# Altium integrated library Capacitor.IntLib: 74 symbols
Pins are listed as number, name and electrical type; pins without a type are passive.

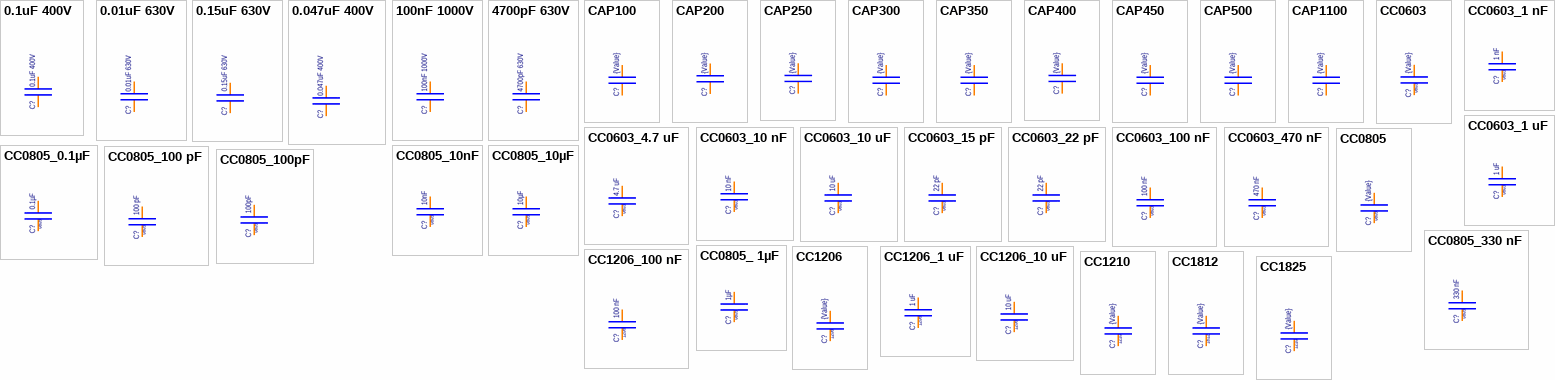
[diagram p0: symbols 0.1uF 400V to CC1825]

## 0.1uF 400V
designator C?  value 0.1uF 400V  (hidden comment: *)
Tolerance: 10%; Publisher: Catcatcat Electronics; website developer: http://catcatcat.d-lan.dp.ua/; ComponentLink1Description: Manufacturer URL; ComponentLink2Description: Datasheet; ComponentLink3Description: Dealer; ComponentLink4Description: DealerАlternative; Assembly type: Manual Part
footprint 0.1X400V
pins: 1, 2

## 0.01uF 630V
designator C?  value 0.01uF 630V  (hidden comment: *)
Tolerance: 10%; Publisher: Catcatcat Electronics; website developer: http://catcatcat.d-lan.dp.ua/; ComponentLink1Description: Manufacturer URL; ComponentLink2Description: Datasheet; ComponentLink3Description: Dealer; ComponentLink4Description: DealerАlternative; Assembly type: Manual Part
footprint CAP250
pins: 1, 2

## 0.15uF 630V
designator C?  value 0.15uF 630V  (hidden comment: *)
Tolerance: 10%; Publisher: Catcatcat Electronics; website developer: http://catcatcat.d-lan.dp.ua/; ComponentLink1Description: Manufacturer URL; ComponentLink2Description: Datasheet; ComponentLink3Description: Dealer; ComponentLink4Description: DealerАlternative; Assembly type: Manual Part
footprint 0.15X630V
pins: 1, 2

## 0.047uF 400V
designator C?  value 0.047uF 400V  (hidden comment: *)
Tolerance: 10%; Publisher: Catcatcat Electronics; website developer: http://catcatcat.d-lan.dp.ua/; ComponentLink1Description: Manufacturer URL; ComponentLink2Description: Datasheet; ComponentLink3Description: Dealer; ComponentLink4Description: DealerАlternative; Assembly type: Manual Part
footprint 0.047X400V
pins: 1, 2

## 100nF 1000V
designator C?  value 100nF 1000V  (hidden comment: *)
Tolerance: 10%; Publisher: Catcatcat Electronics; website developer: http://catcatcat.d-lan.dp.ua/; ComponentLink1Description: Manufacturer URL; ComponentLink2Description: Datasheet; ComponentLink3Description: Dealer; ComponentLink4Description: DealerАlternative; Assembly type: Manual Part
footprint Z5U
pins: 1, 2

## 4700pF 630V
designator C?  value 4700pF 630V  (hidden comment: *)
Tolerance: 10%; Publisher: Catcatcat Electronics; website developer: http://catcatcat.d-lan.dp.ua/; ComponentLink1Description: Manufacturer URL; ComponentLink2Description: Datasheet; ComponentLink3Description: Dealer; ComponentLink4Description: DealerАlternative; Assembly type: Manual Part
footprint CAP200
pins: 1, 2

## CAP100
designator C?  value {Value}  (hidden comment: *)
Tolerance: 10%; Publisher: Catcatcat Electronics; website developer: http://catcatcat.d-lan.dp.ua/; ComponentLink1Description: Manufacturer URL; ComponentLink2Description: Datasheet; ComponentLink3Description: Dealer; ComponentLink4Description: DealerАlternative; Assembly type: Manual Part
footprint CAP100
pins: A, B

## CAP200
designator C?  value {Value}  (hidden comment: *)
Tolerance: 10%; Publisher: Catcatcat Electronics; website developer: http://catcatcat.d-lan.dp.ua/; ComponentLink1Description: Manufacturer URL; ComponentLink2Description: Datasheet; ComponentLink3Description: Dealer; ComponentLink4Description: DealerАlternative; Assembly type: Manual Part
footprint CAP200
pins: 1, 2

## CAP250
designator C?  value {Value}  (hidden comment: *)
Tolerance: 10%; Publisher: Catcatcat Electronics; website developer: http://catcatcat.d-lan.dp.ua/; ComponentLink1Description: Manufacturer URL; ComponentLink2Description: Datasheet; ComponentLink3Description: Dealer; ComponentLink4Description: DealerАlternative; Assembly type: Manual Part
footprint CAP250
pins: 1, 2

## CAP300
designator C?  value {Value}  (hidden comment: *)
Tolerance: 10%; Publisher: Catcatcat Electronics; website developer: http://catcatcat.d-lan.dp.ua/; ComponentLink1Description: Manufacturer URL; ComponentLink2Description: Datasheet; ComponentLink3Description: Dealer; ComponentLink4Description: DealerАlternative; Assembly type: Manual Part
footprint CAP300
pins: A, B

## CAP350
designator C?  value {Value}  (hidden comment: *)
Tolerance: 10%; Publisher: Catcatcat Electronics; website developer: http://catcatcat.d-lan.dp.ua/; ComponentLink1Description: Manufacturer URL; ComponentLink2Description: Datasheet; ComponentLink3Description: Dealer; ComponentLink4Description: DealerАlternative; Assembly type: Manual Part
footprint CAP350
pins: A, B

## CAP400
designator C?  value {Value}  (hidden comment: *)
Tolerance: 10%; Publisher: Catcatcat Electronics; website developer: http://catcatcat.d-lan.dp.ua/; ComponentLink1Description: Manufacturer URL; ComponentLink2Description: Datasheet; ComponentLink3Description: Dealer; ComponentLink4Description: DealerАlternative; Assembly type: Manual Part
footprint CAP400
pins: A, B

## CAP450
designator C?  value {Value}  (hidden comment: *)
Tolerance: 10%; Publisher: Catcatcat Electronics; website developer: http://catcatcat.d-lan.dp.ua/; ComponentLink1Description: Manufacturer URL; ComponentLink2Description: Datasheet; ComponentLink3Description: Dealer; ComponentLink4Description: DealerАlternative; Assembly type: Manual Part
footprint CAP450
pins: A, B

## CAP500
designator C?  value {Value}  (hidden comment: *)
Tolerance: 10%; Publisher: Catcatcat Electronics; website developer: http://catcatcat.d-lan.dp.ua/; ComponentLink1Description: Manufacturer URL; ComponentLink2Description: Datasheet; ComponentLink3Description: Dealer; ComponentLink4Description: DealerАlternative; Assembly type: Manual Part
footprint CAP500
pins: A, B

## CAP1100
designator C?  value {Value}  (hidden comment: *)
Tolerance: 10%; Publisher: Catcatcat Electronics; website developer: http://catcatcat.d-lan.dp.ua/; ComponentLink1Description: Manufacturer URL; ComponentLink2Description: Datasheet; ComponentLink3Description: Dealer; ComponentLink4Description: DealerАlternative; Assembly type: Manual Part
footprint CAP1100
pins: 1, 2

## CC0603
designator C?  value {Value}  (hidden comment: *)
Tolerance: 10%; Voltage: 50 Vdc; Temp.Characteristic: X7R; ComponentLink1URL: http://www.samsungsem.com/global/support/product-search/index.jsp#; Package / Case: 0603(1608) 0.8 mm; Pricing: 0.0018$; Publisher: Catcatcat Electronics; website developer: http://catcatcat.d-lan.dp.ua/; ComponentLink1Description: Manufacturer URL; ComponentLink2Description: Datasheet; ComponentLink3Description: Dealer; ComponentLink4Description: DealerАlternative; ComponentLink4URL: https://voron.ua; Assembly type: Manual Part
footprint CC0603
footprint CD0603
pins: 1, 2 1
text: 0603

## CC0603_1 nF
designator C?  value 1 nF  (hidden comment: *)
Chip Capacitor, 1 nF, +/- 10%, 50 V, -55 to 125 degC, 0603 (1608 Metric); Part Number: CL10B103KB8NNNC; PricingDealer: 0.0000019; Voltage: 50 Vdc; Temp.Characteristic: X7R; ComponentLink1URL: http://www.samsungsem.com/global/support/product-search/index.jsp#; ComponentLink2URL: http://www.samsungsem.com/kr/front/downloadcms.do?path=/kr/support/product-search/mlcc/__icsFiles/afieldfile/2016/08/18&fileName=S_CL10B103KC8NNNC.pdf; Package / Case: 0603(1608) 0.8 mm; Pricing: 0.0018; Publisher: Catcatcat Electronics; Tolerance: 10%; website developer: http://catcatcat.d-lan.dp.ua/; ComponentLink1Description: Manufacturer URL; ComponentLink2Description: Datasheet; ComponentLink3Description: Dealer; ComponentLink3URL: https://detail.1688.com/offer/521370614975.html; ComponentLink4Description: DealerАlternative; Assembly type: Manual Part
footprint CC0603
footprint CD0603
pins: 1, 2 1
text: 0603

## CC0603_1 uF
designator C?  value 1 uF  (hidden comment: *)
Chip Capacitor, 1 uF, +/- 10%, 50 V, -55 to 125 degC, 0603 (1608 Metric); Part Number: CL10B105KA8NNNC; PricingDealer: 0.00066; Voltage: 25 Vdc; Temp.Characteristic: X7R; ComponentLink1URL: http://www.samsungsem.com/global/support/product-search/index.jsp#; ComponentLink2URL: http://www.samsungsem.com/kr/front/downloadcms.do?path=/kr/support/product-search/mlcc/__icsFiles/afieldfile/2016/08/18&fileName=S_CL10B105KA8NNNC.pdf; Package / Case: 0603(1608) 0.8 mm; Pricing: 0.0018; Publisher: Catcatcat Electronics; Tolerance: ±10 %; website developer: http://catcatcat.d-lan.dp.ua/; ComponentLink1Description: Manufacturer URL; ComponentLink2Description: Datasheet; ComponentLink3Description: Dealer; ComponentLink3URL: https://detail.1688.com/offer/520472547450.html; ComponentLink4Description: DealerАlternative; Assembly type: Manual Part
footprint CC0603
footprint CD0603
pins: 1, 2 1
text: 0603

## CC0603_4.7 uF
designator C?  value 4.7 uF  (hidden comment: *)
Chip Capacitor, 4.7 uF, +/- 10%, 50 V, -55 to 125 degC, 0603 (1608 Metric); Part Number: CL10B475KQ8NQND; PricingDealer: 0.000368; Voltage: 6.3 Vdc; Temp.Characteristic: X7R; ComponentLink1URL: http://www.samsungsem.com/global/index.jsp; ComponentLink2URL: http://www.samsungsem.com/kr/support/product-search/mlcc/__icsFiles/afieldfile/2017/10/14/Spec%20sheet_CL10B475KQ8NQND.pdf; Package / Case: 0603(1608) 0.8 mm; Publisher: Catcatcat Electronics; Tolerance: ±10 %; website developer: http://catcatcat.d-lan.dp.ua/; ComponentLink1Description: Manufacturer URL; ComponentLink2Description: Datasheet; ComponentLink3Description: Dealer; ComponentLink3URL: https://detail.1688.com/offer/525123532117.html; ComponentLink4Description: DealerАlternative; ComponentLink4URL: https://voron.ua/; Assembly type: Manual Part
footprint CC0603
footprint CD0603
pins: 1, 2 1
text: 0603

## CC0603_10 nF
designator C?  value 10 nF  (hidden comment: *)
Chip Capacitor, 10 nF, +/- 10%, 50 V, -55 to 125 degC, 0603 (1608 Metric); Part Number: CL10B103KB8NNNC; PricingDealer: 0.0000019; Voltage: 50 Vdc; Temp.Characteristic: X7R; ComponentLink1URL: http://www.samsungsem.com/global/support/product-search/index.jsp#; ComponentLink2URL: http://www.samsungsem.com/kr/front/downloadcms.do?path=/kr/support/product-search/mlcc/__icsFiles/afieldfile/2016/08/18&fileName=S_CL10B103KC8NNNC.pdf; Package / Case: 0603(1608) 0.8 mm; Pricing: 0.0018; Publisher: Catcatcat Electronics; Tolerance: 10%; website developer: http://catcatcat.d-lan.dp.ua/; ComponentLink1Description: Manufacturer URL; ComponentLink2Description: Datasheet; ComponentLink3Description: Dealer; ComponentLink3URL: https://detail.1688.com/offer/521370614975.html; ComponentLink4Description: DealerАlternative; Assembly type: Manual Part
footprint CC0603
footprint CD0603
pins: 1, 2 1
text: 0603

## CC0603_10 uF
designator C?  value 10 uF  (hidden comment: *)
Chip Capacitor, 10 uF, +/- 10%, 50 V, -55 to 125 degC, 0603 (1608 Metric); Part Number: CL10B106MQ8NRNC; PricingDealer: 0.00073; Tolerance: ±20 %; Voltage: 6.3 Vdc; Temp.Characteristic: X7R; ComponentLink1URL: http://www.samsungsem.com/global/support/product-search/index.jsp#; ComponentLink2URL: http://www.samsungsem.com/kr/front/downloadcms.do?path=/kr/support/product-search/mlcc/__icsFiles/afieldfile/2016/08/18&fileName=S_CL10B106MQ8NRNC.pdf; Package / Case: 0603(1608) 0.8 mm; Publisher: Catcatcat Electronics; website developer: http://catcatcat.d-lan.dp.ua/; ComponentLink1Description: Manufacturer URL; ComponentLink2Description: Datasheet; ComponentLink3Description: Dealer; ComponentLink3URL: https://detail.1688.com/offer/520907160439.html; ComponentLink4Description: DealerАlternative; Assembly type: Manual Part
footprint CC0603
footprint CD0603
pins: 1, 2 1
text: 0603

## CC0603_15 pF
designator C?  value 22 pF  (hidden comment: *)
Chip Capacitor, 15 pF, +/- 10%, 50 V, -55 to 125 degC, 0603 (1608 Metric); Part Number: CL10C150JB8NNND; PricingDealer: 0.0000014; Tolerance: ±5 %; Voltage: 50 Vdc; Temp.Characteristic: C0G; ComponentLink1URL: http://www.samsungsem.com/global/support/product-search/index.jsp#; ComponentLink2URL: http://www.samsungsem.com/kr/front/downloadcms.do?path=/kr/support/product-search/mlcc/__icsFiles/afieldfile/2016/08/18&fileName=S_CL10C150JB8NNND.pdf; Package / Case: 0603(1608) 0.8 mm; Pricing: 0.0018; Publisher: Catcatcat Electronics; website developer: http://catcatcat.d-lan.dp.ua/; ComponentLink1Description: Manufacturer URL; ComponentLink2Description: Datasheet; ComponentLink3Description: Dealer; ComponentLink3URL: https://detail.1688.com/offer/536480410744.html; ComponentLink4Description: DealerАlternative; Assembly type: Manual Part
footprint CC0603
footprint CD0603
pins: 1, 2 1
text: 0603

## CC0603_22 pF
designator C?  value 22 pF  (hidden comment: *)
Chip Capacitor, 22 pF, +/- 10%, 50 V, -55 to 125 degC, 0603 (1608 Metric); Part Number: CL10C220JB8NNNL; PricingDealer: 0.0012; Tolerance: ±5 %; Voltage: 50 Vdc; Temp.Characteristic: C0G; ComponentLink1URL: http://www.samsungsem.com/global/support/product-search/index.jsp#; ComponentLink2URL: http://www.samsungsem.com/kr/front/downloadcms.do?path=/kr/support/product-search/mlcc/__icsFiles/afieldfile/2016/08/18&fileName=S_CL10C220JB8NNNL.pdf; Package / Case: 0603(1608) 0.8 mm; Pricing: 0.0018; Publisher: Catcatcat Electronics; website developer: http://catcatcat.d-lan.dp.ua/; ComponentLink1Description: Manufacturer URL; ComponentLink2Description: Datasheet; ComponentLink3Description: Dealer; ComponentLink4Description: DealerАlternative; ComponentLink4URL: https://voron.ua; Assembly type: Manual Part
footprint CC0603
footprint CD0603
pins: 1, 2 1
text: 0603

## CC0603_100 nF
designator C?  value 100 nF  (hidden comment: *)
Chip Capacitor, 100 nF, +/- 10%, 50 V, -55 to 125 degC, 0603 (1608 Metric); Part Number: CL10B104KB8NNNO; PricingDealer: 0.00022; Voltage: 50 Vdc; Temp.Characteristic: X7R; ComponentLink1URL: http://www.samsungsem.com/global/support/product-search/index.jsp#; ComponentLink2URL: http://www.samsungsem.com/kr/front/downloadcms.do?path=/kr/support/product-search/mlcc/__icsFiles/afieldfile/2016/08/18&fileName=S_CL10B104KB8NNNO.pdf; Package / Case: 0603(1608) 0.8 mm; Pricing: 0.0018; Publisher: Catcatcat Electronics; Tolerance: 10%; website developer: http://catcatcat.d-lan.dp.ua/; ComponentLink1Description: Manufacturer URL; ComponentLink2Description: Datasheet; ComponentLink3Description: Dealer; ComponentLink3URL: http://www.zjkdz.net.cn/offer/352808486.html?spm=a2615.7691456.0.0.dQI4KK; ComponentLink4Description: DealerАlternative; Assembly type: Manual Part
footprint CC0603
footprint CD0603
pins: 1, 2 1
text: 0603

## CC0603_470 nF
designator C?  value 470 nF  (hidden comment: *)
Chip Capacitor, 470 nF, +/- 10%, 50 V, -55 to 125 degC, 0603 (1608 Metric); Part Number: CL10B104KB8NNNO; PricingDealer: 0.00022; Voltage: 50 Vdc; Temp.Characteristic: X7R; ComponentLink1URL: http://www.samsungsem.com/global/support/product-search/index.jsp#; ComponentLink2URL: http://www.samsungsem.com/kr/front/downloadcms.do?path=/kr/support/product-search/mlcc/__icsFiles/afieldfile/2016/08/18&fileName=S_CL10B104KB8NNNO.pdf; Package / Case: 0603(1608) 0.8 mm; Pricing: 0.0018; Publisher: Catcatcat Electronics; Tolerance: 10%; website developer: http://catcatcat.d-lan.dp.ua/; ComponentLink1Description: Manufacturer URL; ComponentLink2Description: Datasheet; ComponentLink3Description: Dealer; ComponentLink3URL: http://www.zjkdz.net.cn/offer/352808486.html?spm=a2615.7691456.0.0.dQI4KK; ComponentLink4Description: DealerАlternative; Assembly type: Manual Part
footprint CC0603
footprint CD0603
pins: 1, 2 1
text: 0603

## CC0805
designator C?  value {Value}  (hidden comment: *)
Tolerance: 10%; Publisher: Catcatcat Electronics; website developer: http://catcatcat.d-lan.dp.ua/; ComponentLink1Description: Manufacturer URL; ComponentLink2Description: Datasheet; ComponentLink3Description: Dealer; ComponentLink4Description: DealerАlternative; Assembly type: Manual Part
footprint CC0805
footprint CD0805
pins: 1, 2
text: 0805

## CC0805_0.1µF
designator C?, comment 0.1µF
CAP CER 0.1UF 25V X7R 0805; Part Number: CL21B104KACNNND; Manufacturer: Samsung Electro-Mechanics; PricingDealer: 0.0015; Tolerance: ±10%; Note: Ceramic Capacitors; Detailed Description: 0.1µF ±10% 25V Ceramic Capacitor X7R 0805 (2012 Metric); ComponentLink1URL: http://www.samsungsem.com/global/support/product-search/index.jsp#; ComponentLink2URL: http://www.samsungsem.com/kr/front/downloadcms.do?path=/kr/support/product-search/mlcc/__icsFiles/afieldfile/2016/08/18&fileName=S_CL21B104MBFNNNE.pdf; Package / Case: 0805 (2012 Metric); Pricing: 0.0073; Publisher: Catcatcat Electronics; Voltage: 25V; Temp.Characteristic: X7R; Manufacturer PartNumber: CL21B104KACNNND; HelpURL: http://www.samsungsem.com/kr/support/product-search/mlcc/CL21B104KACNNND.jsp; website developer: http://catcatcat.d-lan.dp.ua/; ComponentLink1Description: Manufacturer URL; ComponentLink2Description: Datasheet; ComponentLink3Description: Dealer; ComponentLink3URL: https://detail.1688.com/offer/546485788226.html; ComponentLink4Description: DealerАlternative; Dealer: https://www.digikey.com/product-detail/en/samsung-electro-mechanics/CL21B104KACNNND/CL21B104KACNNND-ND/3894457; Operating Temperature: -55°C ~ 125°C; Temperature Coefficient: X7R; Value: 0.1µF; Assembly type: Manual Part
footprint CC0805
footprint CD0805
pins: 1, 2
text: 0805

## CC0805_10nF
designator C?, comment 10nF
CAP CER 10000PF 50V X7R 0805; Part Number: CL21B103KBANNND; Manufacturer: Samsung Electro-Mechanics; Tolerance: 10%; Note: Ceramic Capacitors; Detailed Description: 10000pF ±10% 50V Ceramic Capacitor X7R 0805 (2012 Metric); ComponentLink1URL: http://www.samsungsem.com/global/support/product-search/index.jsp#; ComponentLink2URL: http://www.samsungsem.com/kr/front/downloadcms.do?path=/kr/support/product-search/mlcc/__icsFiles/afieldfile/2016/08/18&fileName=S_CL21B103KBCNNNC.pdf; Package / Case: 0805 (2012 Metric); Pricing: 0.00447; Publisher: Catcatcat Electronics; Voltage: 50V; Temp.Characteristic: X7R; Manufacturer PartNumber: CL21B103KBANNND; HelpURL: http://www.samsungsem.com/kr/support/product-search/mlcc/CL21B103KBANNND.jsp; website developer: http://catcatcat.d-lan.dp.ua/; ComponentLink1Description: Manufacturer URL; ComponentLink2Description: Datasheet; ComponentLink3Description: Dealer; ComponentLink3URL: https://detail.1688.com/offer/544989561467.html; ComponentLink4Description: DealerАlternative; Dealer: https://www.digikey.com/product-detail/en/samsung-electro-mechanics/CL21B103KBANNND/CL21B103KBANNND-ND/3894453; Operating Temperature: -55°C ~ 125°C; Temperature Coefficient: X7R; Value: 10nF; Assembly type: Manual Part
footprint CC0805
footprint CD0805
pins: 1, 2
text: 0805

## CC0805_10µF
designator C?, comment 10µF
CAP CER 10UF 6.3V X7R 0805; Part Number: CL21B106KQQNNNF; Manufacturer: Samsung Electro-Mechanics; Tolerance: ±10 %; Note: Ceramic Capacitors; Detailed Description: 10µF ±10% 6.3V Ceramic Capacitor X7R 0805 (2012 Metric); ComponentLink1URL: http://www.samsungsem.com/global/support/product-search/index.jsp#; ComponentLink2URL: http://www.samsungsem.com/kr/front/downloadcms.do?path=/kr/support/product-search/mlcc/__icsFiles/afieldfile/2016/08/18&fileName=S_CL21B106KOQNNNE.pdf; Package / Case: 0805 (2012 Metric); Pricing: 0.02355; Publisher: Catcatcat Electronics; Voltage: 6.3V; Temp.Characteristic: X7R; Manufacturer PartNumber: CL21B106KQQNNNF; HelpURL: http://www.samsungsem.com/kr/support/product-search/mlcc/CL21B106KQQNNNF.jsp; website developer: http://catcatcat.d-lan.dp.ua/; ComponentLink1Description: Manufacturer URL; ComponentLink2Description: Datasheet; ComponentLink3Description: Dealer; ComponentLink3URL: https://detail.1688.com/offer/552003460748.html; ComponentLink4Description: DealerАlternative; Dealer: https://www.digikey.com/product-detail/en/samsung-electro-mechanics/CL21B106KQQNNNF/CL21B106KQQNNNF-ND/3894475; Operating Temperature: -55°C ~ 125°C; Temperature Coefficient: X7R; Value: 10µF; Assembly type: Manual Part
footprint CC0805
footprint CD0805
pins: 1, 2
text: 0805

## CC0805_100 pF
designator C?  value 100 pF  (hidden comment: *)
Chip Capacitor, 100 pF, +/- 10%, 50 V, -55 to 125 degC, 0805 (2012 Metric); Part Number: CL21C101JBANNND; PricingDealer: 0.00036; Tolerance: ±5 %; Voltage: 50 V; Temp.Characteristic: C0G; Note: Ceramic Capacitors; ComponentLink1URL: http://www.samsungsem.com/global/support/product-search/index.jsp#; ComponentLink2URL: http://www.samsungsem.com/kr/front/downloadcms.do?path=/kr/support/product-search/mlcc/__icsFiles/afieldfile/2016/08/18&fileName=S_CL21C101JBANNND.pdf; Package / Case: 0805(2012) 0.65 mm; Pricing: 0.0035; Publisher: Catcatcat Electronics; website developer: http://catcatcat.d-lan.dp.ua/; ComponentLink1Description: Manufacturer URL; ComponentLink2Description: Datasheet; ComponentLink3Description: Dealer; ComponentLink3URL: https://detail.1688.com/offer/540075627190.html; ComponentLink4Description: DealerАlternative; Assembly type: Manual Part
footprint CC0805
footprint CD0805
pins: 1, 2
text: 0805

## CC0805_100pF
designator C?, comment 100pF
CAP CER 100PF 250V C0G/NP0 0805; Part Number: C0805C101JAGAC7800; Manufacturer: KEMET; Tolerance: ±5%; Temp.Characteristic: C0G, NP0; Note: Ceramic Capacitors; Detailed Description: 100pF ±5% 250V Ceramic Capacitor C0G, NP0 0805 (2012 Metric); Package / Case: 0805 (2012 Metric); Pricing: 0.00387; Publisher: Catcatcat Electronics; Voltage: 250V; Manufacturer PartNumber: C0805C101JAGAC7800; HelpURL: https://api.kemet.com/component-edge/download/datasheet/C0805C101JAGAC7800.pdf; website developer: http://catcatcat.d-lan.dp.ua/; ComponentLink1Description: Manufacturer URL; ComponentLink2Description: Datasheet; ComponentLink3Description: Dealer; ComponentLink4Description: DealerАlternative; Dealer: https://www.digikey.com/product-detail/en/kemet/C0805C101JAGAC7800/399-15000-2-ND/7382115; Operating Temperature: -55°C ~ 125°C; Temperature Coefficient: C0G, NP0; Value: 100pF; Assembly type: Manual Part
footprint CC0805
footprint CD0805
pins: 1, 2
text: 0805

## CC0805_330 nF
designator C?  value 330 nF  (hidden comment: *)
Chip Capacitor, 330 nF, +/- 10%, 50 V, -55 to 125 degC, 0805 (2012 Metric); Part Number: CL21B334KBFNNNE; PricingDealer: 0.0020; Voltage: 50 Vdc; Temp.Characteristic: X7R; ComponentLink1URL: http://www.samsungsem.com/global/support/product-search/index.jsp#; ComponentLink2URL: http://www.samsungsem.com/kr/front/downloadcms.do?path=/kr/support/product-search/mlcc/__icsFiles/afieldfile/2016/08/18&fileName=S_CL21B104MBFNNNE.pdf; Package / Case: 0805(2012) 1.25 mm; Pricing: 0.0079; Publisher: Catcatcat Electronics; Tolerance: ±10 %; website developer: http://catcatcat.d-lan.dp.ua/; ComponentLink1Description: Manufacturer URL; ComponentLink2Description: Datasheet; ComponentLink3Description: Dealer; ComponentLink3URL: https://detail.1688.com/offer/549926695645.html; ComponentLink4Description: DealerАlternative; Assembly type: Manual Part
footprint CC0805
footprint CD0805
pins: 1, 2
text: 0805

## CC0805_ 1µF
designator C?, comment 1µF
CAP CER 1UF 16V X7R 0805; Part Number: CL21B105KOFNNNF; Manufacturer: Samsung Electro-Mechanics; Tolerance: ±10%; Note: Ceramic Capacitors; Detailed Description: 1µF ±10% 16V Ceramic Capacitor X7R 0805 (2012 Metric); ComponentLink1URL: http://www.samsungsem.com/global/support/product-search/index.jsp#; ComponentLink2URL: http://www.samsungsem.com/kr/front/downloadcms.do?path=/kr/support/product-search/mlcc/__icsFiles/afieldfile/2016/08/18&fileName=S_CL21B104MBFNNNE.pdf; Package / Case: 0805 (2012 Metric); Pricing: 0.00638; Publisher: Catcatcat Electronics; Voltage: 16V; Temp.Characteristic: X7R; Manufacturer PartNumber: CL21B105KOFNNNF; HelpURL: http://www.samsungsem.com/kr/support/product-search/mlcc/CL21B105KOFNNNF.jsp; website developer: http://catcatcat.d-lan.dp.ua/; ComponentLink1Description: Manufacturer URL; ComponentLink2Description: Datasheet; ComponentLink3Description: Dealer; ComponentLink3URL: https://detail.1688.com/offer/539680851310.html; ComponentLink4Description: DealerАlternative; Dealer: https://www.digikey.com/product-detail/en/samsung-electro-mechanics/CL21B105KOFNNNF/CL21B105KOFNNNF-ND/3894468; Temperature Coefficient: X7R; Value: 1µF; Assembly type: Manual Part
footprint CC0805
footprint CD0805
pins: 1, 2
text: 0805

## CC1206
designator C?  value {Value}  (hidden comment: *)
Tolerance: ±10 %; Voltage: 50 Vdc; Temp.Characteristic: X7R; ComponentLink1URL: http://www.samsungsem.com/global/support/product-search/index.jsp#; Package / Case: 1206(3216) 0.85 mm; Publisher: Catcatcat Electronics; website developer: http://catcatcat.d-lan.dp.ua/; ComponentLink1Description: Manufacturer URL; ComponentLink2Description: Datasheet; ComponentLink3Description: Dealer; ComponentLink4Description: DealerАlternative; ComponentLink4URL: https://voron.ua; Assembly type: Manual Part
footprint CC1206
footprint CC1206
pins: 1, 2
text: 1206

## CC1206_1 uF
designator C?  value 1 uF  (hidden comment: *)
Chip Capacitor, 1 uF, +/- 10%, 50 V, -55 to 125 degC, 1206 (3216 Metric); Part Number: CL31B105KBHNNNE; PricingDealer: 0.0018; Voltage: 50 Vdc; Temp.Characteristic: X7R; ComponentLink1URL: http://www.samsungsem.com/global/support/product-search/index.jsp#; ComponentLink2URL: http://www.samsungsem.com/kr/front/downloadcms.do?path=/kr/support/product-search/mlcc/__icsFiles/afieldfile/2016/08/18&fileName=S_CL31B105KBHNNNE.pdf; Package / Case: 1206(3216) 0.85 mm; Pricing: 0.037; Publisher: Catcatcat Electronics; Tolerance: ±10 %; website developer: http://catcatcat.d-lan.dp.ua/; ComponentLink1Description: Manufacturer URL; ComponentLink2Description: Datasheet; ComponentLink3Description: Dealer; ComponentLink3URL: https://detail.1688.com/offer/544981696860.html; ComponentLink4Description: DealerАlternative; Assembly type: Manual Part
footprint CC1206
footprint CC1206
pins: 1, 2
text: 1206

## CC1206_10 uF
designator C?  value 10 uF  (hidden comment: *)
Chip Capacitor, 10 uF, +/- 10%, 50 V, -55 to 125 degC, 1206 (3216 Metric); Part Number: CL31B106KBHNNNE; PricingDealer: 0.0139; Voltage: 50 Vdc; Temp.Characteristic: X7R; ComponentLink1URL: http://www.samsungsem.com/global/support/product-search/index.jsp#; ComponentLink2URL: http://www.samsungsem.com/kr/support/product-search/mlcc/__icsFiles/afieldfile/2017/10/14/Spec%20sheet_CL31B106KBHNNNE.pdf; Package / Case: 1206(3216) 0.85 mm; Pricing: 0.0374; Publisher: Catcatcat Electronics; Tolerance: ±10 %; website developer: http://catcatcat.d-lan.dp.ua/; ComponentLink1Description: Manufacturer URL; ComponentLink2Description: Datasheet; ComponentLink3Description: Dealer; ComponentLink3URL: https://detail.1688.com/offer/45722213395.html; ComponentLink4Description: DealerАlternative; Assembly type: Manual Part
footprint CC1206
footprint CC1206
pins: 1, 2
text: 1206

## CC1206_100 nF
designator C?  value 100 nF  (hidden comment: *)
Chip Capacitor, 100 nF, +/- 10%, 50 V, -55 to 125 degC, 1206 (3216 Metric); Part Number: CL31B104KBCNNNC; PricingDealer: 0.00092; Voltage: 50 Vdc; Temp.Characteristic: X7R; ComponentLink1URL: http://www.samsungsem.com/global/support/product-search/index.jsp#; ComponentLink2URL: http://www.samsungsem.com/kr/front/downloadcms.do?path=/kr/support/product-search/mlcc/__icsFiles/afieldfile/2016/08/18&fileName=S_CL31B104KBCNNNC.pdf; Package / Case: 1206(3216) 0.85 mm; Pricing: 0.0083; Publisher: Catcatcat Electronics; Tolerance: ±10 %; website developer: http://catcatcat.d-lan.dp.ua/; ComponentLink1Description: Manufacturer URL; ComponentLink2Description: Datasheet; ComponentLink3Description: Dealer; ComponentLink3URL: https://detail.1688.com/offer/525840263851.html; ComponentLink4Description: DealerАlternative; Assembly type: Manual Part
footprint CC1206
footprint CC1206
pins: 1, 2
text: 1206

## CC1210
designator C?  value {Value}  (hidden comment: *)
Tolerance: 10%; Publisher: Catcatcat Electronics; website developer: http://catcatcat.d-lan.dp.ua/; ComponentLink1Description: Manufacturer URL; ComponentLink2Description: Datasheet; ComponentLink3Description: Dealer; ComponentLink4Description: DealerАlternative; Assembly type: Manual Part
footprint CC1210
footprint CC1210
pins: 1, 2
text: 1210

## CC1812
designator C?  value {Value}  (hidden comment: *)
Tolerance: 10%; Publisher: Catcatcat Electronics; website developer: http://catcatcat.d-lan.dp.ua/; ComponentLink1Description: Manufacturer URL; ComponentLink2Description: Datasheet; ComponentLink3Description: Dealer; ComponentLink4Description: DealerАlternative; Assembly type: Manual Part
footprint CC1812
footprint CD1812
pins: 1, 2
text: 1812

## CC1825
designator C?  value {Value}  (hidden comment: *)
Tolerance: 10%; Publisher: Catcatcat Electronics; website developer: http://catcatcat.d-lan.dp.ua/; ComponentLink1Description: Manufacturer URL; ComponentLink2Description: Datasheet; ComponentLink3Description: Dealer; ComponentLink4Description: DealerАlternative; Assembly type: Manual Part
footprint CC1825
footprint CD1825
pins: 1, 2
text: 1210

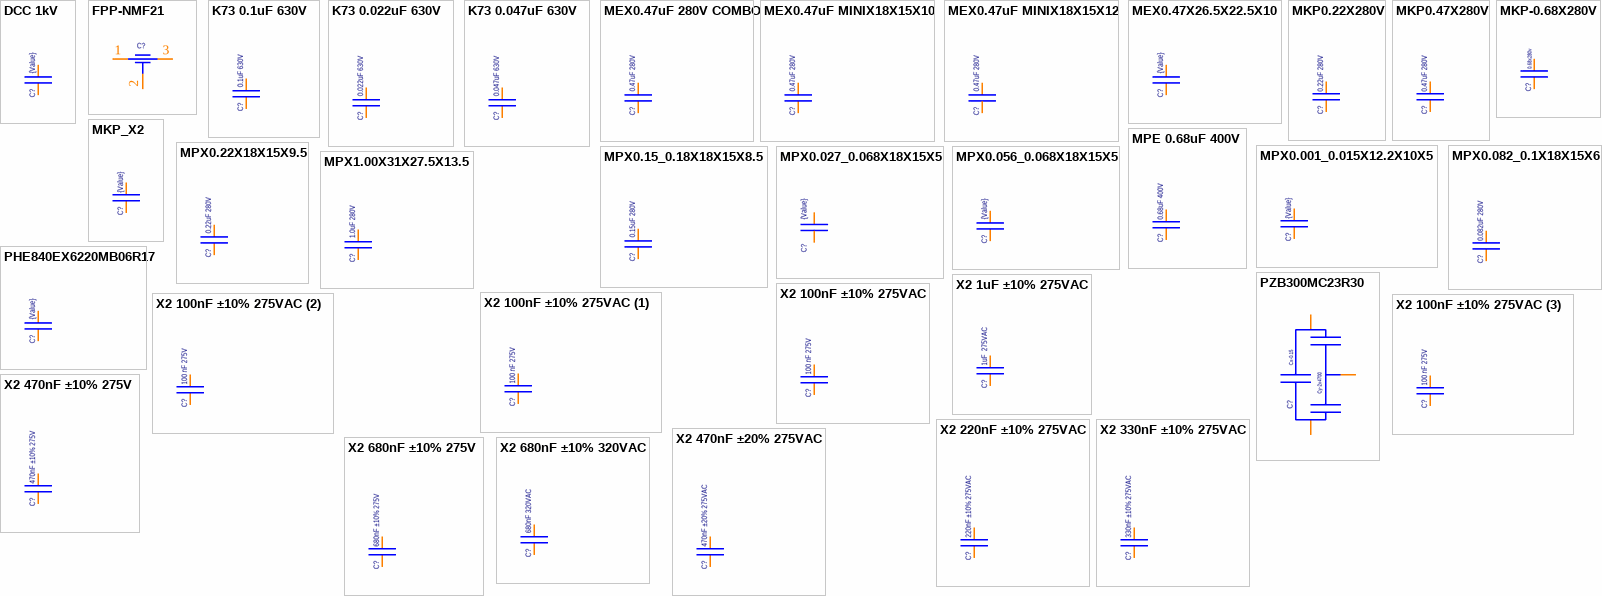
[diagram p1: symbols DCC 1kV to X2 680nF ±10% 320VAC]

## DCC 1kV
designator C?  value {Value}  (hidden comment: *)
Tolerance: 10%; Publisher: Catcatcat Electronics; website developer: http://catcatcat.d-lan.dp.ua/; ComponentLink1Description: Manufacturer URL; ComponentLink2Description: Datasheet; ComponentLink3Description: Dealer; ComponentLink4Description: DealerАlternative; Assembly type: Manual Part
footprint DCC 1kV
pins: 1, 2

## FPP-NMF21
designator C?  (value not drawn)
Tolerance: 10%; Value: *; Publisher: Catcatcat Electronics; website developer: http://catcatcat.d-lan.dp.ua/; ComponentLink1Description: Manufacturer URL; ComponentLink2Description: Datasheet; ComponentLink3Description: Dealer; ComponentLink4Description: DealerАlternative; Assembly type: Manual Part
footprint FPP-NMF21
pins: 1, 2, 3

## K73 0.1uF 630V
designator C?  value 0.1uF 630V  (hidden comment: *)
Tolerance: 10%; Publisher: Catcatcat Electronics; website developer: http://catcatcat.d-lan.dp.ua/; ComponentLink1Description: Manufacturer URL; ComponentLink2Description: Datasheet; ComponentLink3Description: Dealer; ComponentLink4Description: DealerАlternative; Assembly type: Manual Part
footprint 0.1X630-K73
pins: 1, 2

## K73 0.022uF 630V
designator C?  value 0.022uF 630V  (hidden comment: *)
Tolerance: 10%; Publisher: Catcatcat Electronics; website developer: http://catcatcat.d-lan.dp.ua/; ComponentLink1Description: Manufacturer URL; ComponentLink2Description: Datasheet; ComponentLink3Description: Dealer; ComponentLink4Description: DealerАlternative; Assembly type: Manual Part
footprint 0.047X630-K73
pins: 1, 2

## K73 0.047uF 630V
designator C?  value 0.047uF 630V  (hidden comment: *)
Tolerance: 10%; Publisher: Catcatcat Electronics; website developer: http://catcatcat.d-lan.dp.ua/; ComponentLink1Description: Manufacturer URL; ComponentLink2Description: Datasheet; ComponentLink3Description: Dealer; ComponentLink4Description: DealerАlternative; Assembly type: Manual Part
footprint 0.047X630-K73
pins: 1, 2

## MEX0.47uF 280V COMBO
designator C?  value 0.47uF 280V  (hidden comment: *)
Tolerance: 10%; Publisher: Catcatcat Electronics; website developer: http://catcatcat.d-lan.dp.ua/; ComponentLink1Description: Manufacturer URL; ComponentLink2Description: Datasheet; ComponentLink3Description: Dealer; ComponentLink4Description: DealerАlternative; Assembly type: Manual Part
footprint MEX0.47XKOMBO
pins: 1, 2, 3

## MEX0.47uF MINIX18X15X10
designator C?  value 0.47uF 280V  (hidden comment: *)
Tolerance: 10%; Publisher: Catcatcat Electronics; website developer: http://catcatcat.d-lan.dp.ua/; ComponentLink1Description: Manufacturer URL; ComponentLink2Description: Datasheet; ComponentLink3Description: Dealer; ComponentLink4Description: DealerАlternative; Assembly type: Manual Part
footprint MEX0.47MINIX18X15X10
pins: 1, 2

## MEX0.47uF MINIX18X15X12
designator C?  value 0.47uF 280V  (hidden comment: *)
Tolerance: 10%; Publisher: Catcatcat Electronics; website developer: http://catcatcat.d-lan.dp.ua/; ComponentLink1Description: Manufacturer URL; ComponentLink2Description: Datasheet; ComponentLink3Description: Dealer; ComponentLink4Description: DealerАlternative; Assembly type: Manual Part
footprint MEX0.47MINIX18X15X12
pins: 1, 2

## MEX0.47X26.5X22.5X10
designator C?  value {Value}  (hidden comment: *)
Tolerance: 10%; Publisher: Catcatcat Electronics; website developer: http://catcatcat.d-lan.dp.ua/; ComponentLink1Description: Manufacturer URL; ComponentLink2Description: Datasheet; ComponentLink3Description: Dealer; ComponentLink4Description: DealerАlternative; Assembly type: Manual Part
footprint MEX0.47X26.5X22.5X10
pins: 1, 2

## MKP0.22X280V
designator C?  value 0.22uF 280V  (hidden comment: *)
Tolerance: 10%; Publisher: Catcatcat Electronics; website developer: http://catcatcat.d-lan.dp.ua/; ComponentLink1Description: Manufacturer URL; ComponentLink2Description: Datasheet; ComponentLink3Description: Dealer; ComponentLink4Description: DealerАlternative; Assembly type: Manual Part
footprint MEX0.22MINIX18X15X8.5
pins: 1, 2

## MKP0.47X280V
designator C?  value 0.47uF 280V  (hidden comment: *)
Tolerance: 10%; Publisher: Catcatcat Electronics; website developer: http://catcatcat.d-lan.dp.ua/; ComponentLink1Description: Manufacturer URL; ComponentLink2Description: Datasheet; ComponentLink3Description: Dealer; ComponentLink4Description: DealerАlternative; Assembly type: Manual Part
footprint MEX0.47MINIX18X15X10
pins: 1, 2

## MKP-0.68X280V
designator C?  (value not drawn)
Tolerance: 10%; Value: *; Publisher: Catcatcat Electronics; website developer: http://catcatcat.d-lan.dp.ua/; ComponentLink1Description: Manufacturer URL; ComponentLink2Description: Datasheet; ComponentLink3Description: Dealer; ComponentLink4Description: DealerАlternative; Assembly type: Manual Part
footprint MEX0.12X18X15X12
pins: 1, 2
text: 0.68x280v

## MKP_X2
designator C?  value {Value}  (hidden comment: *)
Tolerance: 10%; Publisher: Catcatcat Electronics; website developer: http://catcatcat.d-lan.dp.ua/; ComponentLink1Description: Manufacturer URL; ComponentLink2Description: Datasheet; ComponentLink3Description: Dealer; ComponentLink4Description: DealerАlternative; Assembly type: Manual Part
footprint X2_7.5x4.0x9.0x10.0
footprint X2_7.5x5.0x10.5x10.0
footprint X2_7.5x6.0x11.5x10.0
footprint X2_10.0x4.0x10.0x12.5
footprint X2_10.0x5.0x11.0x12.5
footprint X2_10.0x6.0x12.0x12.5
footprint X2_15.0x5.0x11.0x17.5
footprint X2_15.0x6.0x12.0x17.5
footprint X2_15.0x7.0x13.5x17.5
footprint X2_15.0x8.5x15.0x17.5
footprint X2_22.5x6.0x15.5x26.0
footprint X2_22.5x7.0x16.5x26.0
footprint X2_22.5x8.5x18.0x26.0
pins: 1, 2

## MPE 0.68uF 400V
designator C?  value 0.68uF 400V  (hidden comment: *)
Tolerance: 10%; Publisher: Catcatcat Electronics; website developer: http://catcatcat.d-lan.dp.ua/; ComponentLink1Description: Manufacturer URL; ComponentLink2Description: Datasheet; ComponentLink3Description: Dealer; ComponentLink4Description: DealerАlternative; Assembly type: Manual Part
footprint 0.68X400-MPE
pins: 1, 2

## MPX0.001_0.015X12.2X10X5
designator C?  value {Value}  (hidden comment: *)
Tolerance: 10%; Publisher: Catcatcat Electronics; website developer: http://catcatcat.d-lan.dp.ua/; ComponentLink1Description: Manufacturer URL; ComponentLink2Description: Datasheet; ComponentLink3Description: Dealer; ComponentLink4Description: DealerАlternative; Assembly type: Manual Part
footprint MPX0.001_0.015X12.2X10X5
pins: 1, 2

## MPX0.15_0.18X18X15X8.5
designator C?  value 0.15uF 280V  (hidden comment: *)
Tolerance: 10%; Publisher: Catcatcat Electronics; website developer: http://catcatcat.d-lan.dp.ua/; ComponentLink1Description: Manufacturer URL; ComponentLink2Description: Datasheet; ComponentLink3Description: Dealer; ComponentLink4Description: DealerАlternative; Assembly type: Manual Part
footprint MPX0.15_0.18X18X15X8.5
pins: 1, 2

## MPX0.22X18X15X9.5
designator C?  value 0.22uF 280V  (hidden comment: *)
Tolerance: 10%; Publisher: Catcatcat Electronics; website developer: http://catcatcat.d-lan.dp.ua/; ComponentLink1Description: Manufacturer URL; ComponentLink2Description: Datasheet; ComponentLink3Description: Dealer; ComponentLink4Description: DealerАlternative; Assembly type: Manual Part
footprint MPX0.22X18X15X9.5
pins: 1, 2

## MPX0.027_0.068X18X15X5
designator C?  value {Value}  (hidden comment: *)
Tolerance: 10%; Publisher: Catcatcat Electronics; website developer: http://catcatcat.d-lan.dp.ua/; ComponentLink1Description: Manufacturer URL; ComponentLink2Description: Datasheet; ComponentLink3Description: Dealer; ComponentLink4Description: DealerАlternative; Assembly type: Manual Part
footprint MPX0.027_0.068X18X15X5
pins: 1, 2

## MPX0.056_0.068X18X15X5
designator C?  value {Value}  (hidden comment: *)
Tolerance: 10%; Publisher: Catcatcat Electronics; website developer: http://catcatcat.d-lan.dp.ua/; ComponentLink1Description: Manufacturer URL; ComponentLink2Description: Datasheet; ComponentLink3Description: Dealer; ComponentLink4Description: DealerАlternative; Assembly type: Manual Part
footprint MPX0.056_0.068X18X15X5
pins: 1, 2

## MPX0.082_0.1X18X15X6
designator C?  value 0.082uF 280V  (hidden comment: *)
Tolerance: 10%; Publisher: Catcatcat Electronics; website developer: http://catcatcat.d-lan.dp.ua/; ComponentLink1Description: Manufacturer URL; ComponentLink2Description: Datasheet; ComponentLink3Description: Dealer; ComponentLink4Description: DealerАlternative; Assembly type: Manual Part
footprint MPX0.082_0.1X18X15X6
pins: 1, 2

## MPX1.00X31X27.5X13.5
designator C?  value 1.0uF 280V  (hidden comment: *)
Tolerance: 10%; Publisher: Catcatcat Electronics; website developer: http://catcatcat.d-lan.dp.ua/; ComponentLink1Description: Manufacturer URL; ComponentLink2Description: Datasheet; ComponentLink3Description: Dealer; ComponentLink4Description: DealerАlternative; Assembly type: Manual Part
footprint MPX1.00X31X27.5X13.5
pins: 1, 2

## PHE840EX6220MB06R17
designator C?  value {Value}  (hidden comment: *)
Tolerance: 10%; Publisher: Catcatcat Electronics; website developer: http://catcatcat.d-lan.dp.ua/; ComponentLink1Description: Manufacturer URL; ComponentLink2Description: Datasheet; ComponentLink3Description: Dealer; ComponentLink4Description: DealerАlternative; Assembly type: Manual Part
footprint PHE840EX6220MB06R17
pins: 1, 2

## PZB300MC23R30
designator C?  (value not drawn)
Tolerance: 10%; Value: *; Publisher: Catcatcat Electronics; website developer: http://catcatcat.d-lan.dp.ua/; ComponentLink1Description: Manufacturer URL; ComponentLink2Description: Datasheet; ComponentLink3Description: Dealer; ComponentLink4Description: DealerАlternative; Assembly type: Manual Part
footprint PZB300MC23R30
pins: 1, 2, 3
text: Cx-0.15; Cy-2x4700

## X2 1uF ±10% 275VAC
designator C?, comment value 1uF  275VAC  (hidden comment: MP2105KGD8RLC)
1uF ±10% 275VAC 15 Through Hole,P=15mm Suppression Capacitors RoHS; Manufacturer: RD(Shenzhen Sincerity Tech); Package / Case: Through Hole,P=15mm; Publisher: Catcatcat Electronics; Tolerance: ±10%; Note: Suppression Capacitors; Manufacturer PartNumber: MP2105KGD8RLC; HelpURL: https://datasheet.lcsc.com/szlcsc/1809211118_SRD-Shenzhen-Sincerity-Tech-MP2105KGD8RLC_C105765.pdf; website developer: http://catcatcat.d-lan.dp.ua/; ComponentLink1Description: Manufacturer URL; ComponentLink2Description: Datasheet; ComponentLink3Description: Dealer; ComponentLink4Description: DealerАlternative; Detailed Description: 1uF ±10% 275VAC 15 Through Hole,P=15mm Suppression Capacitors RoHS; Assembly type: Manual Part; PartNumber LCSC: C105765; Pricing LCSC: 0.140909
footprint X2_7.5x4.0x9.0x10.0
footprint X2_7.5x5.0x10.5x10.0
footprint X2_7.5x6.0x11.5x10.0
footprint X2_10.0x4.0x10.0x12.5
footprint X2_10.0x5.0x11.0x12.5
footprint X2_10.0x6.0x12.0x12.5
footprint X2_15.0x5.0x11.0x17.5
footprint X2_15.0x6.0x12.0x17.5
footprint X2_15.0x7.0x13.5x17.5
footprint X2_15.0x8.5x15.0x17.5
footprint X2_22.5x6.0x15.5x26.0
footprint X2_22.5x7.0x16.5x26.0
footprint X2_22.5x8.5x18.0x26.0
pins: 1, 2

## X2 100nF ±10% 275VAC
designator C?, comment value 100 nF 275V  (hidden comment: X2P2104KN1B0130120060ES0)
100nF ±10% 275VAC 10 Through Hole,P=10mm Suppression Capacitors RoHS; Manufacturer: STE(Songtian Elec); Manufacturer PartNumber: SMQP104K275XXC3B1015; Voltage: 275V; Package / Case: Through Hole,P=10mm; Publisher: Catcatcat Electronics; Tolerance: 10%; HelpURL: https://datasheet.lcsc.com/szlcsc/1809281132_STE-Songtian-Elec-X2P2104KN1B0130120060ES0_C286020.pdf; website developer: http://catcatcat.d-lan.dp.ua/; ComponentLink1Description: Manufacturer URL; ComponentLink2Description: Datasheet; ComponentLink3Description: Dealer; ComponentLink4Description: DealerАlternative; Detailed Description: 100nF ±10% 275VAC 10 Through Hole,P=10mm Suppression Capacitors RoHS; Assembly type: Manual Part; Dealer LCSC: https://lcsc.com/product-detail/Suppression-Capacitors_CHAMPION-SMQP104K275XXC3B1015_C263653.html; PartNumber LCSC: C286020; Pricing LCSC: 0.024
footprint X2_13.0x6.0x12.0x10.0_2 (X2P2104KN1B0130120060ES0)
pins: 1, 2

## X2 100nF ±10% 275VAC (1)
designator C?, comment value 100 nF 275V  (hidden comment: SMXDX104KD2XXAB1515)
100nF ±10% 275VAC 15 Through Hole,P=15mm Suppression Capacitors RoHS; Manufacturer: DAIN Elec; Voltage: 275V; Package / Case: Through Hole,P=15mm; Publisher: Catcatcat Electronics; Tolerance: 10%; Manufacturer PartNumber: SMXDX104KD2XXAB1515; HelpURL: https://datasheet.lcsc.com/szlcsc/1809291017_DAIN-Elec-SMXDX104KD2XXAB1515_C155786.pdf; website developer: http://catcatcat.d-lan.dp.ua/; ComponentLink1Description: Manufacturer URL; ComponentLink2Description: Datasheet; ComponentLink3Description: Dealer; ComponentLink4Description: DealerАlternative; Detailed Description: 100nF ±10% 275VAC 15 Through Hole,P=15mm Suppression Capacitors RoHS; Assembly type: Manual Part; Dealer LCSC: https://lcsc.com/product-detail/Suppression-Capacitors_DAIN-Elec-SMXDX104KD2XXAB1515_C155786.html; PartNumber LCSC: C155786; Pricing LCSC: 0.025
footprint X2_18.0x6.0x12.0x15.0 (SMXDX104KD2XXAB1515)
pins: 1, 2

## X2 100nF ±10% 275VAC (2)
designator C?, comment value 100 nF 275V  (hidden comment: SMQP104K275XXC3B1015)
100nF ±10% 275VAC 10 Through Hole,P=10mm Suppression Capacitors RoHS; Manufacturer: SRD(Shenzhen Sincerity Tech); Voltage: 275V; Package / Case: Through Hole,P=10mm; Publisher: Catcatcat Electronics; Tolerance: 10%; Manufacturer PartNumber: SMQP104K275XXC3B1015; HelpURL: https://datasheet.lcsc.com/szlcsc/1811081329_CHAMPION-SMQP104K275XXC3B1015_C263653.pdf; website developer: http://catcatcat.d-lan.dp.ua/; ComponentLink1Description: Manufacturer URL; ComponentLink2Description: Datasheet; ComponentLink3Description: Dealer; ComponentLink4Description: DealerАlternative; Detailed Description: 100nF ±10% 275VAC 10 Through Hole,P=10mm Suppression Capacitors RoHS; Assembly type: Manual Part; Dealer LCSC: https://lcsc.com/product-detail/Suppression-Capacitors_CHAMPION-SMQP104K275XXC3B1015_C263653.html; PartNumber LCSC: C263653; Pricing LCSC: 0.04
footprint X2_13.0x6.0x12.0x10.0 (https://lcsc.com/product-detail/SuSMQP104K275XXC3B1015)
pins: 1, 2

## X2 100nF ±10% 275VAC (3)
designator C?, comment value 100 nF 275V  (hidden comment: MP2104KGC3XLC)
100nF ±10% 275VAC 10 Through Hole,P=10mm Suppression Capacitors RoHS; Manufacturer: SRD(Shenzhen Sincerity Tech); Voltage: 275V; Package / Case: Through Hole,P=10mm; Publisher: Catcatcat Electronics; Tolerance: 10%; Manufacturer PartNumber: MP2104KGC3XLC; HelpURL: https://datasheet.lcsc.com/szlcsc/1811141426_SRD-Shenzhen-Sincerity-Tech-MP2104KGC3XLC_C105759.pdf; website developer: http://catcatcat.d-lan.dp.ua/; ComponentLink1Description: Manufacturer URL; ComponentLink2Description: Datasheet; ComponentLink3Description: Dealer; ComponentLink4Description: DealerАlternative; Detailed Description: 100nF ±10% 275VAC 10 Through Hole,P=10mm Suppression Capacitors RoHS; Assembly type: Manual Part; Dealer LCSC: https://lcsc.com/product-detail/Suppression-Capacitors_SRD-Shenzhen-Sincerity-Tech-MP2104KGC3XLC_C105759.html; PartNumber LCSC: C105759; Pricing LCSC: 0.03
footprint MPX0.001_0.015X12.2X10X5
pins: 1, 2

## X2 220nF ±10% 275VAC
designator C?, comment value 220nF ±10% 275VAC  (hidden comment: SMQP224K275XXD4B1520)
220nF ±10% 275VAC 15 Through Hole,P=15mm Suppression Capacitors RoHS; Manufacturer: CHAMPION; Package / Case: Through Hole,P=15mm; Publisher: Catcatcat Electronics; Tolerance: 10%; Manufacturer PartNumber: SMQP224K275XXD4B1520; HelpURL: https://datasheet.lcsc.com/szlcsc/1811081329_CHAMPION-SMQP224K275XXD4B1520_C263663.pdf; website developer: http://catcatcat.d-lan.dp.ua/; ComponentLink1Description: Manufacturer URL; ComponentLink2Description: Datasheet; ComponentLink3Description: Dealer; ComponentLink4Description: DealerАlternative; Detailed Description: 220nF ±10% 275VAC 15 Through Hole,P=15mm Suppression Capacitors RoHS; Assembly type: Manual Part; PartNumber LCSC: C263663; Pricing LCSC: 0.052539
footprint MEX0_18X08X14
pins: 1, 2

## X2 330nF ±10% 275VAC
designator C?, comment value 330nF ±10% 275VAC  (hidden comment: MEX334K275A04)
330nF ±10% 275VAC Through Hole,P=15mm Suppression Capacitors RoHS; Manufacturer: TENTA ELEC INDUSTRIAL; Package / Case: Through Hole,P=15mm; Publisher: Catcatcat Electronics; Tolerance: 10%; Manufacturer PartNumber: MEX334K275A04; HelpURL: https://datasheet.lcsc.com/szlcsc/1809202111_TENTA-ELEC-INDUSTRIAL-MEX334K275A04_C8973.pdf; website developer: http://catcatcat.d-lan.dp.ua/; ComponentLink1Description: Manufacturer URL; ComponentLink2Description: Datasheet; ComponentLink3Description: Dealer; ComponentLink4Description: DealerАlternative; Detailed Description: 330nF ±10% 275VAC Through Hole,P=15mm Suppression Capacitors RoHS; Assembly type: Manual Part; PartNumber LCSC: C8973; Pricing LCSC: 0.158433
footprint MEX0_18X10X16
pins: 1, 2

## X2 470nF ±10% 275V
designator C?, comment value 470nF ±10% 275V  (hidden comment: PX474K3ID42H045B9R)
470nF ±10% 275V 15 -40℃ ~ +100℃ Through Hole,P=15mm Mylar Capacitor RoHS; Manufacturer: Carli; Package / Case: Through Hole,P=15mm; Publisher: Catcatcat Electronics; Tolerance: 10%; Manufacturer PartNumber: PX474K3ID42H045B9R; HelpURL: https://datasheet.lcsc.com/szlcsc/1912111437_Carli-PX474K3ID42H045B9R_C430870.pdf; website developer: http://catcatcat.d-lan.dp.ua/; ComponentLink1Description: Manufacturer URL; ComponentLink2Description: Datasheet; ComponentLink3Description: Dealer; ComponentLink4Description: DealerАlternative; Detailed Description: 470nF ±10% 275V 15 -40℃ ~ +100℃ Through Hole,P=15mm Mylar Capacitor RoHS; Assembly type: Manual Part; PartNumber LCSC: C430870; Pricing LCSC: 0.1651
footprint MEX0_18X10X16
pins: 1, 2

## X2 470nF ±20% 275VAC
designator C?, comment value 470nF ±20% 275VAC  (hidden comment: R46KI347000N0M)
470nF ±20% 275VAC 15 Through Hole,P=15mm Suppression Capacitors RoHS; Manufacturer: KEMET; Tolerance: 10%; Package / Case: Through Hole,P=15mm; Publisher: Catcatcat Electronics; Manufacturer PartNumber: R46KI347000N0M; HelpURL: https://datasheet.lcsc.com/szlcsc/1806111448_KEMET-R46KI347000N0M_C183584.pdf; website developer: http://catcatcat.d-lan.dp.ua/; ComponentLink1Description: Manufacturer URL; ComponentLink2Description: Datasheet; ComponentLink3Description: Dealer; ComponentLink4Description: DealerАlternative; Detailed Description: 470nF ±20% 275VAC; Assembly type: Manual Part; PartNumber LCSC: C183584; Pricing LCSC: 0.282483
footprint MEX0_18X10X16
pins: 1, 2

## X2 680nF ±10% 275V
designator C?, comment value 680nF ±10% 275V  (hidden comment: PX684K3ID69H200D9R)
680nF ±10% 275V 15 -40℃ ~ +100℃ Through Hole,P=15mm Mylar Capacitor RoHS; Manufacturer: Carli; Package / Case: Through Hole,P=15mm; Publisher: Catcatcat Electronics; Tolerance: 10%; Manufacturer PartNumber: PX684K3ID69H200D9R; HelpURL: https://datasheet.lcsc.com/szlcsc/1912111437_Carli-PX684K3ID69H200D9R_C430873.pdf; website developer: http://catcatcat.d-lan.dp.ua/; ComponentLink1Description: Manufacturer URL; ComponentLink2Description: Datasheet; ComponentLink3Description: Dealer; ComponentLink4Description: DealerАlternative; Detailed Description: 680nF ±10% 275V 15 -40℃ ~ +100℃ Through Hole,P=15mm Mylar Capacitor RoHS; Assembly type: Manual Part; PartNumber LCSC: C430873; Pricing LCSC: 0.2334
footprint MEX0_18X12X21
pins: 1, 2

## X2 680nF ±10% 320VAC
designator C?, comment value 680nF 320VAC  (hidden comment: MP2684KVDARLC)
680nF ±10% 320VAC 15 Through Hole,P=15mm Suppression Capacitors RoH; Manufacturer: SRD(Shenzhen Sincerity Tech); Package / Case: Through Hole,P=15mm; Publisher: Catcatcat Electronics; Tolerance: ±10%; Voltage: 320VAC; Note: Suppression Capacitors; Manufacturer PartNumber: MP2684KVDARLC; HelpURL: https://datasheet.lcsc.com/szlcsc/1810262206_SRD-Shenzhen-Sincerity-Tech-MP2684KVDARLC_C105860.pdf; website developer: http://catcatcat.d-lan.dp.ua/; ComponentLink1Description: Manufacturer URL; ComponentLink2Description: Datasheet; ComponentLink3Description: Dealer; ComponentLink4Description: DealerАlternative; Detailed Description: 680nF ±10% 320VAC 15 Through Hole,P=15mm Suppression Capacitors RoH; Assembly type: Manual Part; PartNumber LCSC: C105860; Pricing LCSC: 0.141188
footprint MPX0.15_0.18X18X15X8.5
pins: 1, 2